# Altium footprint library PRL_PDC.PcbLib: 77 footprints (part 4 of 5)
Each footprint in its own frame and in the unit in brackets; x right, y up, seen from the top. Pads: shape width x height; smd on the part's side, far side on the other; paste and mask are expansions set on the pad; w line width, h text height; cw(c..) or ccw(c..) is an arc to the next point about the centre after c.
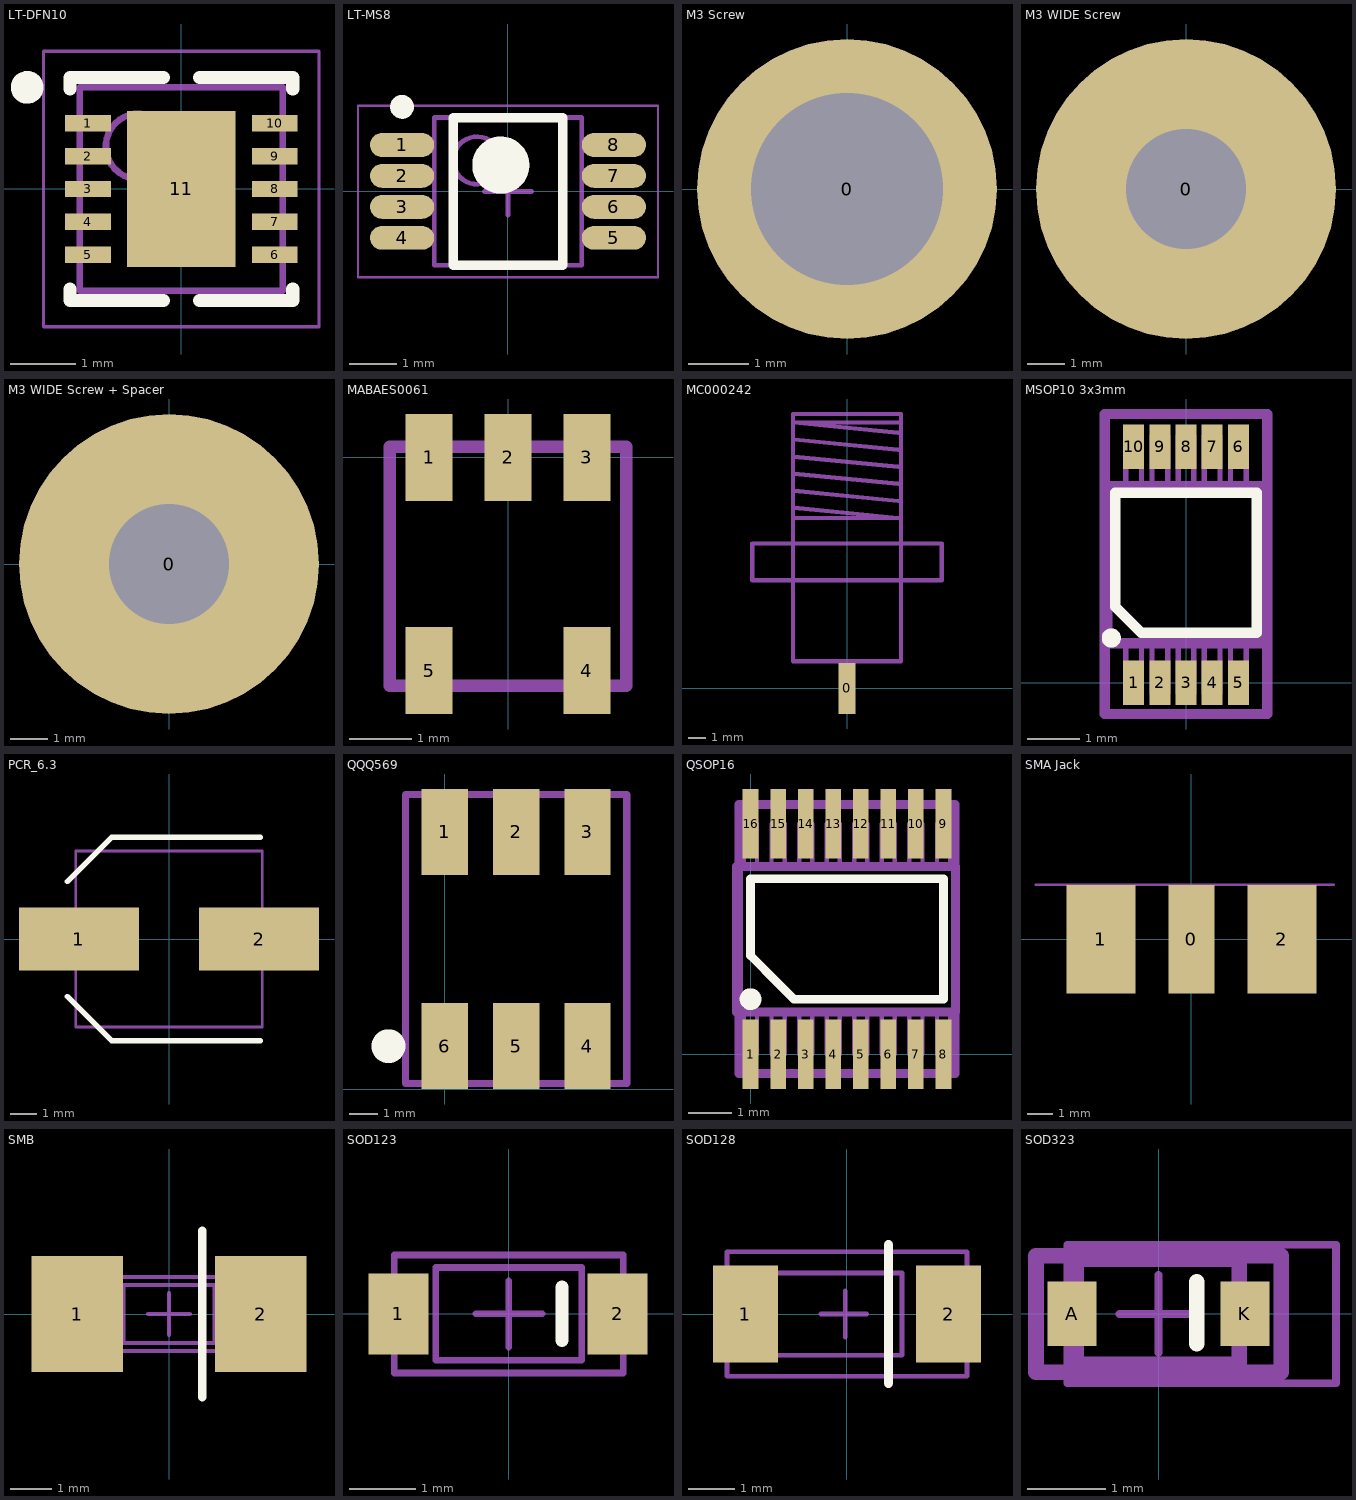
[diagram p3: the footprints below, top view; thin cyan lines are the x and y axes]

## LT-DFN10 [mm] "QFN, 10-Leads, Body 3,00x3,00mm, Pitch 0,50mm, Thermal Pad 1,65x2,54mm, IPC Medium Density"
height 0.8
pads (11):
  rect 0.7x0.25 smd: 1(-1.425,1) 2(-1.425,0.5) 3(-1.425,0) 4(-1.425,-0.5) 5(-1.425,-1) 6(1.425,-1) 7(1.425,-0.5) 8(1.425,0) 9(1.425,0.5) 10(1.425,1)
  rect 1.65x2.38 smd: 11(0,0)
Top Overlay:
  circle w0.25: c-2.35,1.55 r0.125
  lines w0.2: -1.7,-1.525 -1.7,-1.7 -0.275,-1.7 ; -1.7,1.525 -1.7,1.7 -0.275,1.7 ; 0.275,-1.7 1.7,-1.7 1.7,-1.525 ; 0.275,1.7 1.7,1.7 1.7,1.525
Mechanical 13:
  circle w0.1: c-0.65,0.65 r0.5
  lines w0.1: -1.55,-1.55 -1.55,1.55 1.55,1.55 1.55,-1.55 -1.55,-1.55
Mechanical 15:
  lines w0.05: -2.1,-2.1 -2.1,2.1 2.1,2.1 2.1,-2.1 -2.1,-2.1
  lines w0.1: -0.5,0 0.5,0 ; 0,-0.5 0,0.5
3D body: height 0.8, standoff 0.01, extent -1.55,-1.55 1.55,1.55

## LT-MS8 [mm] "TSOP, 8-Leads, Body 3,00x3,00mm, Pitch 0,65mm, IPC Medium Density"
height 1.1
pads (8):
  oval 1.35x0.5 smd: 1(-2.225,0.975) 2(-2.225,0.325) 3(-2.225,-0.325) 4(-2.225,-0.975) 5(2.225,-0.975) 6(2.225,-0.325) 7(2.225,0.325) 8(2.225,0.975)
Top Overlay:
  circle w0.25: c-2.225,1.775 r0.125
  circle w0.6: c-0.15,0.55 r0.3
  lines w0.2: -1.15,-1.55 -1.15,1.55 1.15,1.55 1.15,-1.55 -1.15,-1.55
Mechanical 13:
  circle w0.1: c-0.65,0.65 r0.5
  lines w0.1: -1.55,-1.55 -1.55,1.55 1.55,1.55 1.55,-1.55 -1.55,-1.55
Mechanical 15:
  lines w0.05: -3.15,-1.8 -3.15,1.8 3.15,1.8 3.15,-1.8 -3.15,-1.8
  lines w0.1: -0.5,0 0.5,0 ; 0,-0.5 0,0.5
3D body: height 1.1, standoff 0.1, extent -1.55,-1.55 1.55,1.55

## M3 Screw [mm] "M3mmx10mm Screw"
height 10
pads (1):
  round 5 hole 3.2: 0(0,0)
3D body "NORDEX-DJS-M3-10.step": height 1.65, standoff -7.65, extent -1.9,-1.9 1.9,1.9

## M3 WIDE Screw [mm] "M3mmx10mm Screw"
height 10
pads (1):
  round 8 hole 3.2: 0(0,0)
3D body "NORDEX-DJS-M3-10.step": height 1.65, standoff -7.65, extent -1.9,-1.9 1.9,1.9

## M3 WIDE Screw + Spacer [mm] "M3mmx10mm Screw + 10mm Spacer"
height 10
pads (1):
  round 8 hole 3.2: 0(0,0)
3D body "NORDEX-DJS-M3-10.step": height 1.65, standoff -7.65, extent -1.9,-1.9 1.9,1.9
3D body "M3x10 distancer.step": height -1, standoff -11, extent -2.5,-2.874 2.5,2.9

## MABAES0061 [mm]
height 5
pads (5):
  rect 0.76x1.4 smd paste-0.1: 1(-1.27,0) 2(0,0) 3(1.27,0) 4(1.27,-3.43) 5(-1.27,-3.43)
Mechanical 1:
  lines w0.2: -1.905,-3.673 -1.905,0.173 1.905,0.173 1.905,-3.673 -1.905,-3.673
3D body "sm22.step": height 2.83, standoff 0, extent -1.905,-4.163 1.905,0.663

## MC000242 [mm] "SMA Bulkhead Jack  Front Mount"
height 1
pads (1):
  rect 1x3 smd paste-0.1: 0(0,0)
Mechanical 1:
  lines w0.254: -3.1,10 3.1,10 ; -3.1,10.6 3,10 ; -3.1,11.6 3,11 ; -3.1,12.6 3,12 ; -3.1,13.6 3,13 ; -3.1,14.6 3,14 ; 3,15 -3.1,15.6 3.1,15.6 ; -5.55,6.34 -5.55,8.5 5.55,8.5 5.55,6.34 -5.55,6.34 ; -3.171,1.6 -3.171,16.1 3.169,16.1 3.169,1.6 -3.171,1.6
3D body: height 0.5, standoff 0, extent -0.249,-1.4 0.249,16.1
3D body: height 2.82, standoff -2.32, extent -2.571,1.6 2.569,16.1
3D body: height 5.8, standoff -5.3, extent -5.55,6.34 5.55,8.5
3D body: height 3.42, standoff -2.92, extent -3.17,9.5 3.17,15.5
3D body: height 3.42, standoff -2.92, extent -3.17,1.59 3.17,5.59
3D body: height 5.25, standoff -4.75, extent -5,5.8 5,7.5

## MSOP10 3x3mm [mm] "MSOP10 3x3mm"
height 2
pads (10):
  rect 0.4x0.85 smd: 1(-1,0) 2(-0.5,0) 3(0,0) 4(0.5,0) 5(1,0) 6(1,4.5) 7(0.5,4.5) 8(0,4.5) 9(-0.5,4.5) 10(-1,4.5)
Top Overlay:
  circle w0.254: c-1.425,0.85 r0.056
  lines w0.2: -1.35,1.45 -1.35,3.625 1.35,3.625 1.35,0.95 1.175,0.95 -0.85,0.95 -1.35,1.45
Mechanical 13:
  lines w0.2: -1.55,-0.6 -1.55,5.125 1.55,5.125 1.55,-0.6 -1.55,-0.6
Mechanical 15:
  lines w0.1: -1.15,0.75 -1.15,-0.2 -0.85,-0.2 -0.85,0.75 ; -1.15,3.75 -1.15,4.7 -0.85,4.7 -0.85,3.75 ; -0.65,0.75 -0.65,-0.2 -0.35,-0.2 -0.35,0.75 ; -0.65,3.75 -0.65,4.7 -0.35,4.7 -0.35,3.75 ; -0.15,0.75 -0.15,-0.2 0.15,-0.2 0.15,0.75 ; -0.15,3.75 -0.15,4.7 0.15,4.7 0.15,3.75 ; 0.35,0.75 0.35,-0.2 0.65,-0.2 0.65,0.75 ; 0.35,3.75 0.35,4.7 0.65,4.7 0.65,3.75 ; 0.85,0.75 0.85,-0.2 1.15,-0.2 1.15,0.75 ; 0.85,3.75 0.85,4.7 1.15,4.7 1.15,3.75
  lines w0.2: 1.5,0.75 1.5,3.75 -1.5,3.75 -1.5,0.75 1.5,0.75 ; 1.5,0.75 1.5,0.75
3D body "MSOP10.STEP": height 1.1, standoff 0, extent -1.55,-0.268 1.55,4.768

## PCR_6.3 [mm] "Aluminum Electrolytic Capacitor, Body d6.3 x 7.7mm"
height 8
pads (2):
  rect 4.5x2.35 smd: 1(-3.375,0) 2(3.375,0)
Top Overlay:
  lines w0.2: -3.81,-2.159 -2.159,-3.81 3.429,-3.81 ; -3.81,2.159 -2.159,3.81 3.429,3.81
Mechanical 1:
  lines w0.1: -3.5,-3.3 3.5,-3.3 3.5,3.3 -3.5,3.3 -3.5,-3.3
3D body "User Library-Nichicon_CW6_3x8_7.step": height 8.78, standoff 0, extent -3.5,-3.3 3.5,3.3

## QQQ569 [mm] "Mini-Circuits  QQQ569"
height 6
pads (6):
  rect 1.65x3.05 smd: 1(0,9.145) 2(2.54,9.145) 3(5.08,9.145) 4(5.08,1.525) 5(2.54,1.525) 6(0,1.525)
Top Overlay:
  circle w1: c-2,1.525 r0.1
Mechanical 1:
  lines w0.254: -1.395,0.192 6.475,0.192 6.475,10.478 -1.395,10.478 -1.395,0.192
3D body "QQQ569.STEP": height 5.7, standoff 0.01, extent -1.395,0.192 6.475,10.478

## QSOP16 [mm] "16-Lead Quarter Small-Outline Package"
height 2
pads (16):
  rect 0.36x1.6 smd: 1(0,0) 2(0.635,0) 3(1.27,0) 4(1.905,0) 5(2.54,0) 6(3.175,0) 7(3.81,0) 8(4.445,0) 9(4.445,5.31) 10(3.81,5.31) 11(3.175,5.31) 12(2.54,5.31) 13(1.905,5.31) 14(1.27,5.31) 15(0.635,5.31) 16(0,5.31)
Top Overlay:
  circle w0.3: c0,1.27 r0.1
  lines w0.2: 0.635,4.04 4.445,4.04 ; 0.635,4.04 4.445,4.04 ; 0.635,4.04 0,4.04 0,2.273 0.635,1.638 1.003,1.27 4.445,1.27 4.445,4.04
Mechanical 1:
  lines w0.2: -0.268,-0.445 -0.268,5.755 4.713,5.755 4.713,-0.445 -0.268,-0.445
Mechanical 15:
  lines w0.1: -0.15,1 -0.15,0 0.15,0 0.15,1 ; -0.15,4.31 -0.15,5.31 0.15,5.31 0.15,4.31 ; 0.485,1 0.485,0 0.785,0 0.785,1 ; 0.485,4.31 0.485,5.31 0.785,5.31 0.785,4.31 ; 1.12,1 1.12,0 1.42,0 1.42,1 ; 1.12,4.31 1.12,5.31 1.42,5.31 1.42,4.31 ; 1.755,1 1.755,0 2.055,0 2.055,1 ; 1.755,4.31 1.755,5.31 2.055,5.31 2.055,4.31 ; 2.39,1 2.39,0 2.69,0 2.69,1 ; 2.39,4.31 2.39,5.31 2.69,5.31 2.69,4.31 ; 3.025,1 3.025,0 3.325,0 3.325,1 ; 3.025,4.31 3.025,5.31 3.325,5.31 3.325,4.31 ; 3.66,1 3.66,0 3.96,0 3.96,1 ; 3.66,4.31 3.66,5.31 3.96,5.31 3.96,4.31 ; 4.295,1 4.295,0 4.595,0 4.595,1 ; 4.295,4.31 4.295,5.31 4.595,5.31 4.595,4.31
  lines w0.2: -0.325,0.975 -0.325,4.325 4.725,4.325 4.725,0.975 -0.325,0.975
3D body "User Library-QSOP16-1.step": height 1.85, standoff 0.09, extent -0.267,-0.56 4.713,5.64

## SMA Jack [mm] "SMA Jack Board Edge"
pads (3):
  rect 1.78x4.19 smd paste-0.1: 0(0,0)
  rect 2.665x4.19 smd paste-0.1: 1(-3.492,0) 2(3.492,0)
Mechanical 1:
  lines w0.1: -6,2.1 -3.125,2.1 2.625,2.1 5.5,2.1
3D body "732512120.stp": height 3.88, standoff -2.47, extent -3.175,-1.628 3.175,14.628

## SMB [mm] "SMB DIODE"
height 1
pads (2):
  rect 2.2x2.8 smd: 1(-2.21,0) 2(2.21,0)
Top Overlay:
  lines w0.2: 0.8,-2 0.8,2
Mechanical 13:
  lines w0.1: -1.1,-0.7 1.1,-0.7 1.1,0.7 -1.1,0.7 -1.1,-0.7
Mechanical 15:
  lines w0.1: -0.5,0 0.5,0 ; 0,-0.5 0,0.5 ; -1.727,-0.889 -1.727,0.889 1.727,0.889 1.727,-0.889 -1.727,-0.889
Mechanical 30:
  lines w0.1: -1.727,-0.892 -1.727,0.889 1.727,0.889 1.727,-0.892 -1.727,-0.892
  text ".Designator" at -1.975,-0.425 h0.8
Mechanical 31:
  lines w0.1: -1.727,-0.892 -1.727,0.889 1.727,0.889 1.727,-0.892 -1.727,-0.892
  text ".Comment" at -2.025,-0.45 h0.8
3D body: height 1.01, standoff 0, extent 0.7,-0.7 0.9,0.7
3D body "SBM.step": height 2.45, standoff 0.03, extent -2.75,-1.95 2.75,1.95

## SOD123 [mm] "SOD123 DIODE"
height 1
pads (2):
  rect 0.91x1.22 smd: 1(-1.664,0) 2(1.638,0)
Top Overlay:
  lines w0.2: 0.8,-0.4 0.8,0.4
Mechanical 13:
  lines w0.1: -1.1,-0.7 -1.1,0.7 1.1,0.7 1.1,-0.7 -1.1,-0.7
Mechanical 15:
  lines w0.1: -0.5,0 0.5,0 ; 0,-0.5 0,0.5 ; -1.727,-0.889 1.727,-0.889 1.727,0.889 -1.727,0.889 -1.727,-0.889
Mechanical 30:
  lines w0.1: -1.727,-0.892 1.727,-0.892 1.727,0.889 -1.727,0.889 -1.727,-0.892
  text ".Designator" at -1.975,-0.425 h0.8
Mechanical 31:
  lines w0.1: -1.727,-0.892 1.727,-0.892 1.727,0.889 -1.727,0.889 -1.727,-0.892
  text ".Comment" at -2.025,-0.45 h0.8
3D body: height 0.5, standoff 0.05, extent -1.675,-0.3 1.675,0.3
3D body: height 1.01, standoff 0, extent 0.7,-0.7 0.9,0.7
3D body: height 1, standoff 0, extent -1.05,-0.675 1.05,0.675

## SOD128 [mm] "SOD128 DIODE"
height 1
pads (2):
  rect 1.4x2.1 smd: 1(-2.2,0) 2(2.2,0)
Top Overlay:
  lines w0.2: 0.9,-1.5 0.9,1.5
Mechanical 13:
  lines w0.1: -2.6,-1.35 -2.6,1.35 2.6,1.35 2.6,-1.35 -2.6,-1.35
Mechanical 15:
  lines w0.1: -0.573,0 0.427,0 ; -0.036,-0.5 -0.036,0.5 ; -2.6,-1.35 -2.6,1.35 2.6,1.35 2.6,-1.35 -2.6,-1.35
Mechanical 30:
  lines w0.1: -2.263,-0.892 -2.263,0.889 1.191,0.889 1.191,-0.892 -2.263,-0.892
  text ".Designator" at -2.511,-0.425 h0.8
Mechanical 31:
  lines w0.1: -2.263,-0.892 -2.263,0.889 1.191,0.889 1.191,-0.892 -2.263,-0.892
  text ".Comment" at -2.561,-0.45 h0.8
3D body "SOD-128.step": height 1.11, standoff 0, extent -2.6,-1.35 2.6,1.35

## SOD323 [mm] "SOD323DIODE"
height 1
pads (2):
  rect 0.63x0.83 smd: A(-1.11,0) K(1.11,0)
Top Overlay:
  lines w0.2: 0.49,-0.385 0.49,0.415
Mechanical 1:
  lines w0.2: -1.06,-0.65 1.04,-0.65 1.04,0.7 -1.06,0.7 -1.06,-0.65
Mechanical 15:
  lines w0.1: -0.5,0 0.5,0 ; 0,-0.5 0,0.5
  lines w0.2: -1.575,-0.75 -1.575,0.75 1.575,0.75 1.575,-0.75 -1.575,-0.75
Mechanical 30:
  lines w0.1: -1.174,-0.892 -1.174,0.889 2.281,0.889 2.281,-0.892 -1.174,-0.892
  text ".Designator" at -1.421,-0.425 h0.8
Mechanical 31:
  lines w0.1: -1.174,-0.892 -1.174,0.889 2.281,0.889 2.281,-0.892 -1.174,-0.892
  text ".Comment" at -1.471,-0.45 h0.8
3D body: height 1, standoff 0, extent -1.06,-0.65 1.04,0.7
3D body: height 1.01, standoff 0, extent 0.59,-0.675 0.79,0.725
3D body: height 0.5, standoff 0.05, extent -1.121,-0.3 1.11,0.3